# Altium footprint library THU.PcbLib: 477 footprints (part 5 of 30)
Each footprint in its own frame and in the unit in brackets; x right, y up, seen from the top. Pads: shape width x height; smd on the part's side, far side on the other; paste and mask are expansions set on the pad; w line width, h text height; cw(c..) or ccw(c..) is an arc to the next point about the centre after c.
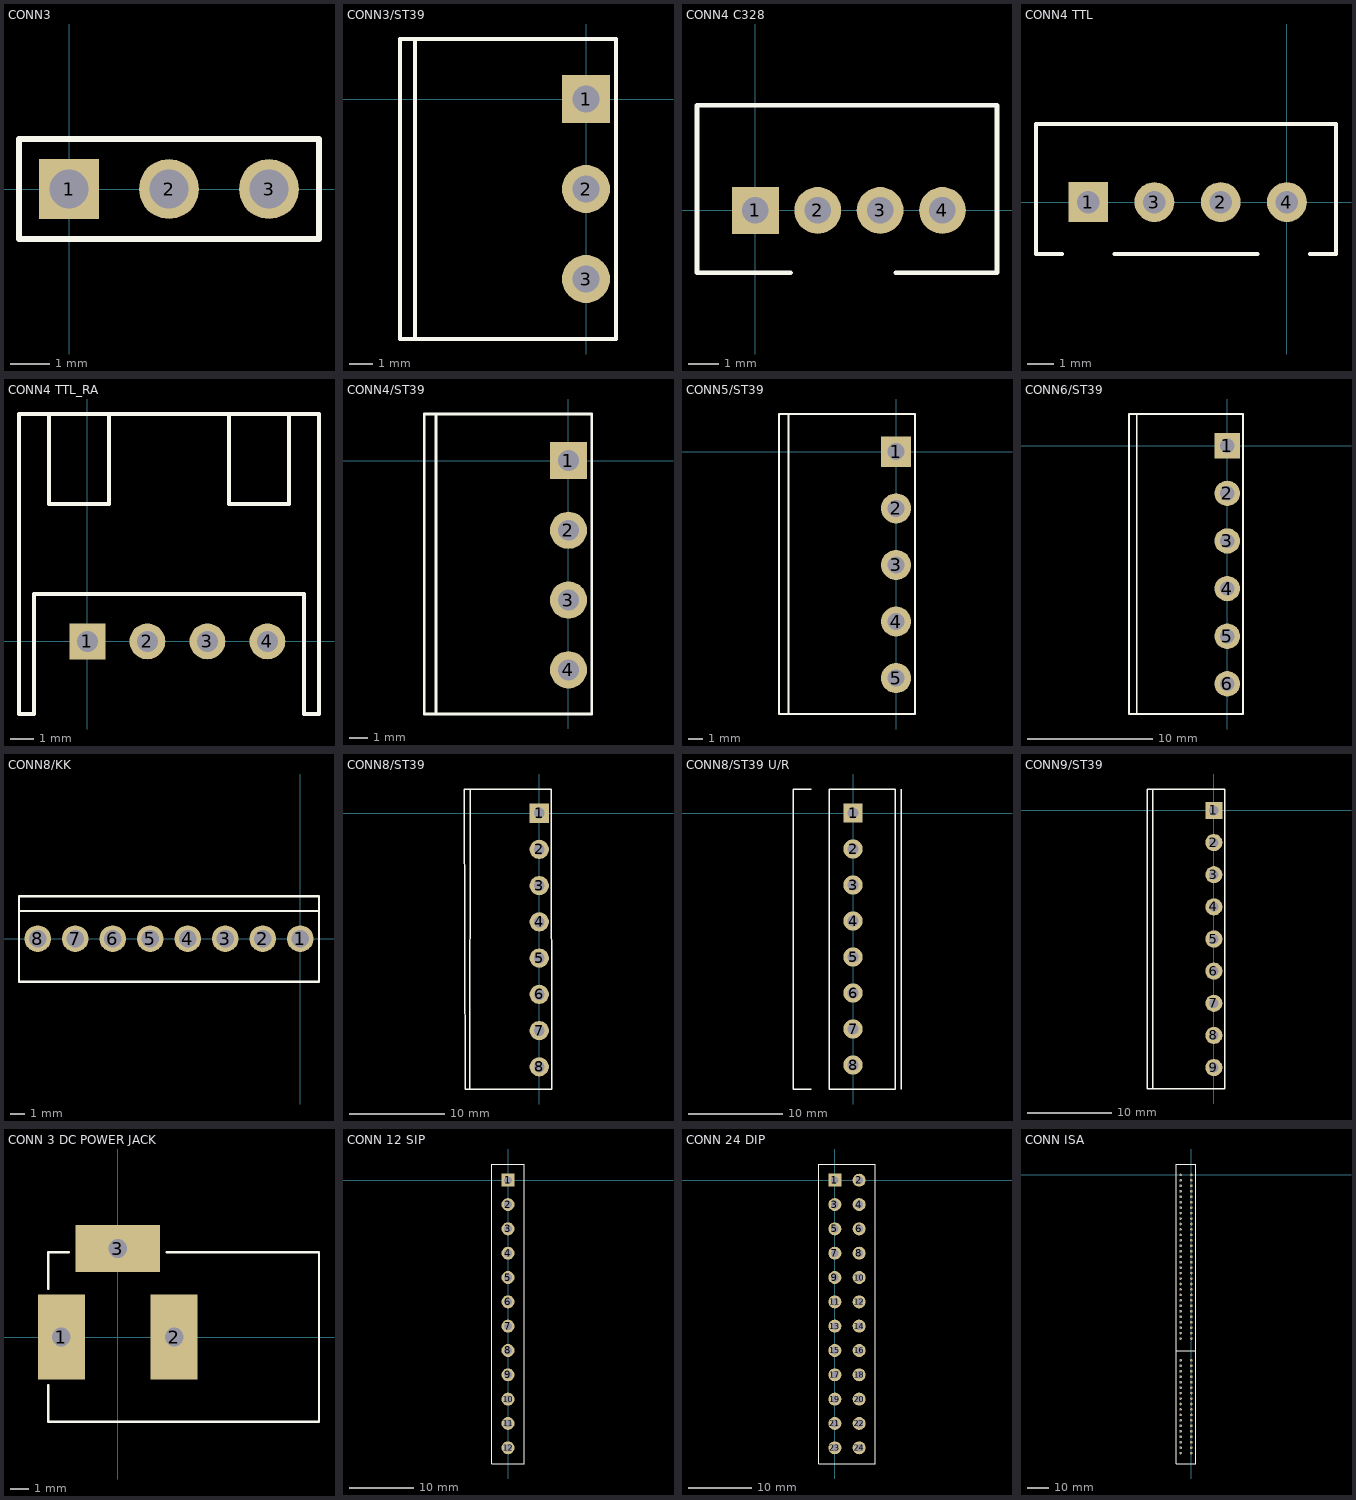
[diagram p4: the footprints below, top view; thin cyan lines are the x and y axes]

## CONN3 [mil]
pads (3):
  rect 60x60 hole 39.37: 1(0,0)
  round 60 hole 39.37: 2(100,0) 3(200,0)
TopOverlay:
  lines w6: -50,-50 -50,50 250,50 250,-50 -50,-50

## CONN3/ST39 [mil]
pads (3):
  rect 80x80 hole 45: 1(0,0)
  round 80 hole 45: 2(0,-150) 3(0,-300)
TopOverlay:
  lines w6: -285,-400 -285,100 ; -310,-400 -310,100 50,100 50,-400 -310,-400

## CONN4 C328 [mil]
pads (4):
  rect 60x60 hole 34: 1(0,0)
  round 60 hole 34: 2(80,0) 3(160,0) 4(240,0)
TopOverlay:
  lines w6: 45,-80 -75,-80 -75,135 310,135 310,-80 180,-80

## CONN4 TTL [mil]
pads (4):
  rect 60x60 hole 34: 1(-300,0)
  round 60 hole 34: 2(-100,0) 3(-200,0) 4(0,0)
TopOverlay:
  lines w6: -339.37,-78.74 -378.74,-78.74 -378.74,0 -378.74,118.11 74.02,118.11 74.02,0 74.02,-78.74 34.65,-78.74 ; -260.63,-78.74 -44.09,-78.74

## CONN4 TTL_RA [mil]
pads (4):
  rect 60x60 hole 35: 1(0,0)
  round 60 hole 35: 2(100,0) 3(200,0) 4(300,0)
TopOverlay:
  lines w6: -64,379 -64,229 36,229 36,379 ; 236,379 236,229 336,229 336,379 ; -114,-121 -114,379 386,379 386,-121 361,-121 361,79 -89,79 -89,-121 -114,-121

## CONN4/ST39 [mil]
pads (4):
  rect 80x80 hole 45: 1(0,0)
  round 80 hole 45: 2(0,-150) 3(0,-300) 4(0,-450)
TopOverlay:
  lines w6: -285,-545 -285,100 ; -310,-545 -310,100 50,100 50,-545 -310,-545

## CONN5/ST39 [mil]
pads (5):
  rect 80x80 hole 45: 1(0,0)
  round 80 hole 45: 2(0,-150) 3(0,-300) 4(0,-450) 5(0,-600)
TopOverlay:
  lines w6: -285,-695 -285,100 ; -310,-695 50,-695 50,100 -310,100 -310,-695

## CONN6/ST39 [mil]
pads (6):
  rect 80x80 hole 45: 1(0,0)
  round 80 hole 45: 2(0,-150) 3(0,-300) 4(0,-450) 5(0,-600) 6(0,-750)
TopOverlay:
  lines w6: -285,-845 -285,100 ; -310,-845 50,-845 50,100 -310,100 -310,-845

## CONN8/KK [mm] "22-27-2081 KK 254 VERTICAL, 8 CIRCUIT"
height 0.297
pads (8):
  round 1.8 hole 1.2: 1(0,0) 2(-2.54,0) 3(-5.08,0) 4(-7.62,0) 5(-10.16,0) 6(-12.7,0) 7(-15.24,0) 8(-17.78,0)
TopOverlay:
  lines w0.152: -19.05,1.88 1.245,1.88 ; -19.05,-2.92 1.27,-2.92 1.27,0 1.27,2.88 -19.05,2.88 -19.05,0 -19.05,-2.92

## CONN8/ST39 [mil]
pads (8):
  rect 80x80 hole 45: 1(0,0)
  round 80 hole 45: 2(0,-150) 3(0,-300) 4(0,-450) 5(0,-600) 6(0,-750) 7(0,-900) 8(0,-1050)
TopOverlay:
  lines w6: -287.4,-1141.73 -285,100 ; -310,100 50,100 51.18,-1141.73 -307.09,-1141.73 -310,100

## CONN8/ST39 U/R [mil]
pads (8):
  rect 80x80 hole 45: 1(0,0)
  round 80 hole 45: 2(0,-150) 3(0,-300) 4(0,-450) 5(0,-600) 6(0,-750) 7(0,-900) 8(0,-1050)
TopOverlay:
  lines w6: -175,-1150 -200,-1150 -250,-1150 -250,100 -175,100 ; 200,-1150 200,100 ; -100,-1150 175,-1150 175,100 -100,100 -100,-1150

## CONN9/ST39 [mil]
pads (9):
  rect 80x80 hole 45: 1(0,0)
  round 80 hole 45: 2(0,-150) 3(0,-300) 4(0,-450) 5(0,-600) 6(0,-750) 7(0,-900) 8(0,-1050) 9(0,-1200)
TopOverlay:
  lines w6: -285,-1300 -285,100 ; -310,-1300 50,-1300 50,100 -310,100 -310,-1300

## CONN 3 DC POWER JACK [mm] "PJ-002BH"
height 11
pads (3):
  rect 2.5x4.5 hole 1 square: 1(-3,0) 2(3,0)
  rect 4.5x2.5 hole 1 square: 3(0,4.7)
TopOverlay:
  lines w0.127: -3.7,-2.557 -3.7,-4.5 10.7,-4.5 10.7,4.5 2.595,4.5 ; -3.7,2.557 -3.7,4.5 -2.612,4.5
3D body "pj-002bh.stp": height 11, standoff -3.5, extent -3.644,-4.445 10.756,4.955

## CONN 12 SIP [mil]
pads (12):
  rect 80x80 hole 47.24: 1(0,0)
  round 80 hole 47.24: 2(0,-150) 3(0,-300) 4(0,-450) 5(0,-600) 6(0,-750) 7(0,-900) 8(0,-1050) 9(0,-1200) 10(0,-1350) 11(0,-1500) 12(0,-1650)
TopOverlay:
  lines w6: -100,-1750 100,-1750 100,100 -100,100 -100,-1750

## CONN 24 DIP [mil]
pads (24):
  rect 80x80 hole 47.24: 1(0,0)
  round 80 hole 47.24: 2(150,0) 3(0,-150) 4(150,-150) 5(0,-300) 6(150,-300) 7(0,-450) 8(150,-450) 9(0,-600) 10(150,-600) 11(0,-750) 12(150,-750) 13(0,-900) 14(150,-900) 15(0,-1050) 16(150,-1050) 17(0,-1200) 18(150,-1200) 19(0,-1350) 20(150,-1350) 21(0,-1500) 22(150,-1500) 23(0,-1650) 24(150,-1650)
TopOverlay:
  lines w6: -100,-1750 -100,100 250,100 250,-1750 -100,-1750

## CONN ISA [mm]
pads (98):
  round 1.2 hole 0.6: A1(0,0) A2(0,-2.54) A3(0,-5.08) A4(0,-7.62) A5(0,-10.16) A6(0,-12.7) A7(0,-15.24) A8(0,-17.78) A9(0,-20.32) A10(0,-22.86) A11(0,-25.4) A12(0,-27.94) A13(0,-30.48) A14(0,-33.02) A15(0,-35.56) A16(0,-38.1) A17(0,-40.64) A18(0,-43.18) A19(0,-45.72) A20(0,-48.26) A21(0,-50.8) A22(0,-53.34) A23(0,-55.88) A24(0,-58.42) A25(0,-60.96) A26(0,-63.5) A27(0,-66.04) A28(0,-68.58) A29(0,-71.12) A30(0,-73.66) A31(0,-76.2) B1(-5.08,0) B2(-5.08,-2.54) B3(-5.08,-5.08) B4(-5.08,-7.62) B5(-5.08,-10.16) B6(-5.08,-12.7) B7(-5.08,-15.24) B8(-5.08,-17.78) B9(-5.08,-20.32) B10(-5.08,-22.86) B11(-5.08,-25.4) B12(-5.08,-27.94) B13(-5.08,-30.48) B14(-5.08,-33.02) B15(-5.08,-35.56) B16(-5.08,-38.1) B17(-5.08,-40.64) B18(-5.08,-43.18) B19(-5.08,-45.72) B20(-5.08,-48.26) B21(-5.08,-50.8) B22(-5.08,-53.34) B23(-5.08,-55.88) B24(-5.08,-58.42) B25(-5.08,-60.96) B26(-5.08,-63.5) B27(-5.08,-66.04) B28(-5.08,-68.58) B29(-5.08,-71.12) B30(-5.08,-73.66) B31(-5.08,-76.2) C1(0,-86.36) C2(0,-88.9) C3(0,-91.44) C4(0,-93.98) C5(0,-96.52) C6(0,-99.06) C7(0,-101.6) C8(0,-104.14) C9(0,-106.68) C10(0,-109.22) C11(0,-111.76) C12(0,-114.3) C13(0,-116.84) C14(0,-119.38) C15(0,-121.92) C16(0,-124.46) C17(0,-127) C18(0,-129.54) D1(-5.08,-86.36) D2(-5.08,-88.9) D3(-5.08,-91.44) D4(-5.08,-93.98) D5(-5.08,-96.52) D6(-5.08,-99.06) D7(-5.08,-101.6) D8(-5.08,-104.14) D9(-5.08,-106.68) D10(-5.08,-109.22) D11(-5.08,-111.76) D12(-5.08,-114.3) D13(-5.08,-116.84) D14(-5.08,-119.38) D15(-5.08,-121.92) D16(-5.08,-124.46) D17(-5.08,-127) D18(-5.08,-129.54)
TopOverlay:
  lines w0.152: -7.087,-81.788 2.032,-81.788 ; -7.112,-134.62 -7.112,5.08 2.032,5.08 2.032,-134.62 -7.112,-134.62